# Altium footprint library 3.10-变压器.PcbLib: 33 footprints (part 1 of 3)
Each footprint in its own frame and in the unit in brackets; x right, y up, seen from the top. Pads: shape width x height; smd on the part's side, far side on the other; paste and mask are expansions set on the pad; w line width, h text height; cw(c..) or ccw(c..) is an arc to the next point about the centre after c.
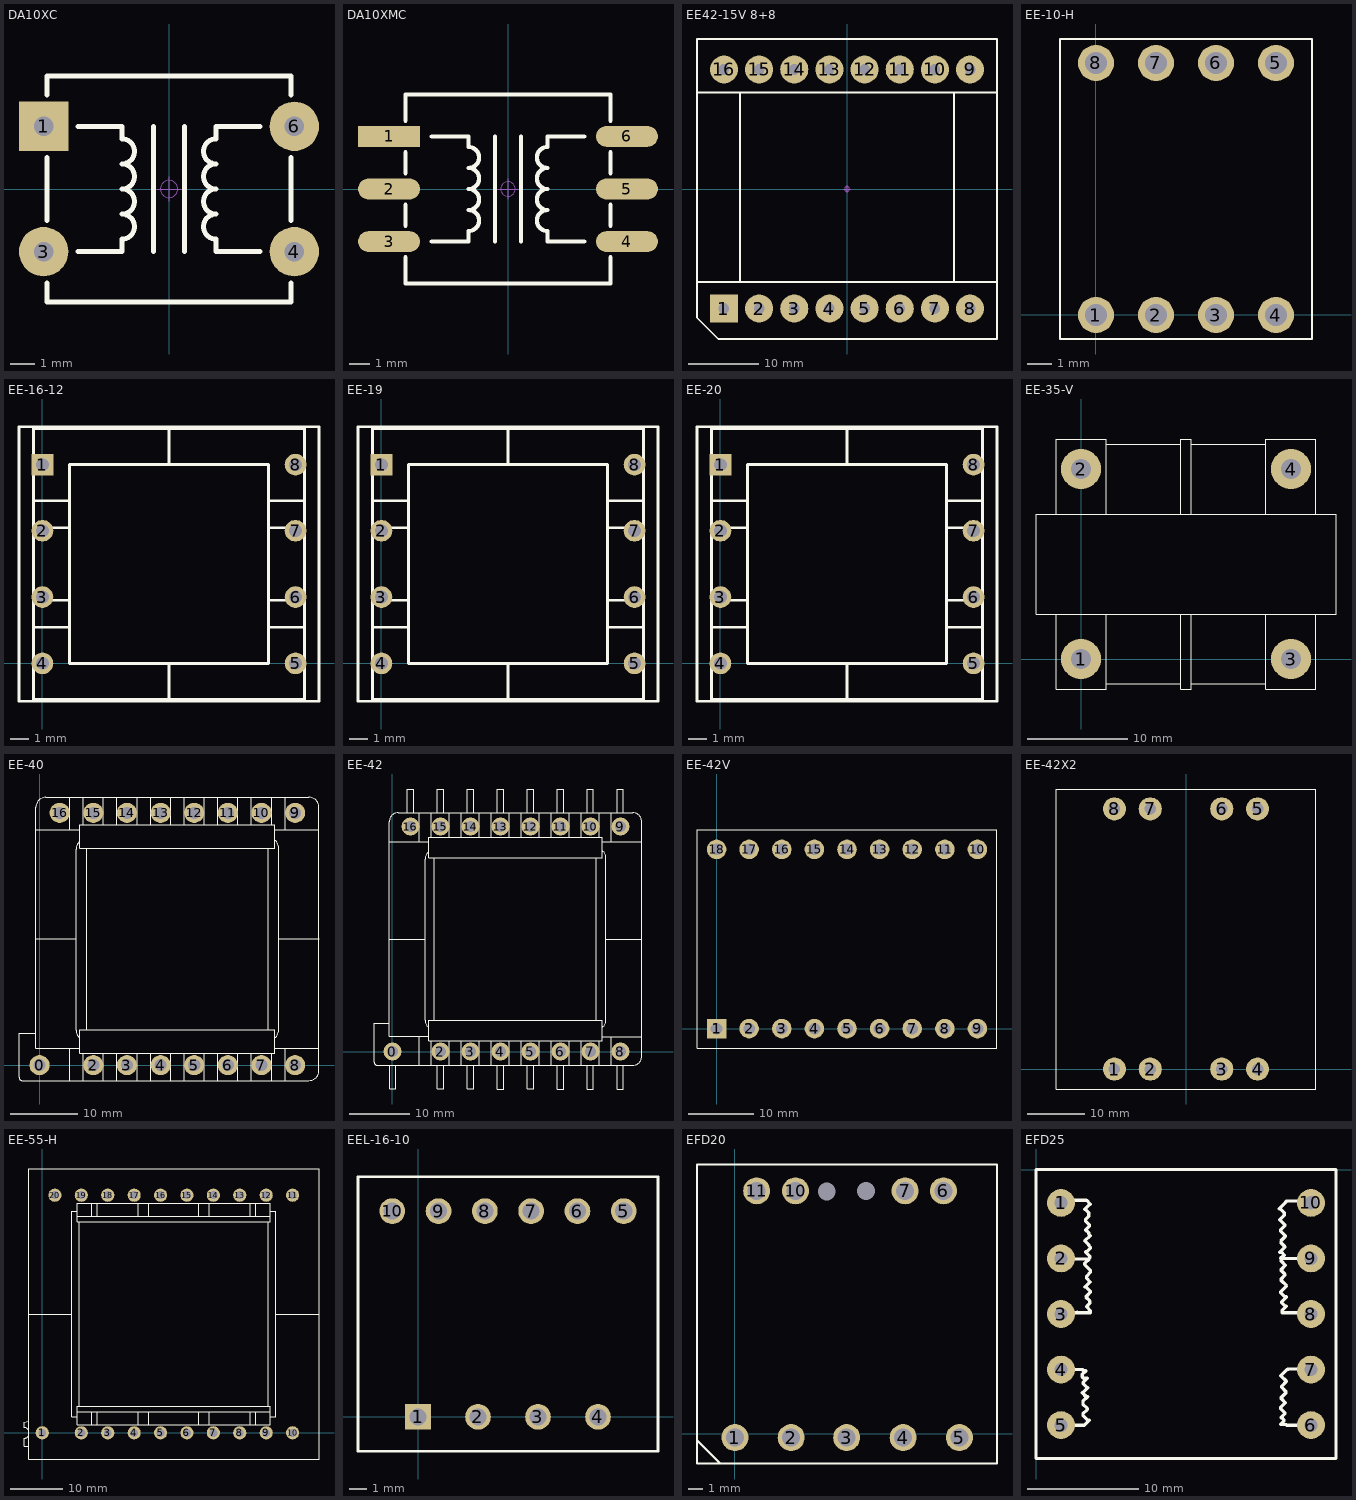
[diagram p0: the footprints below, top view; thin cyan lines are the x and y axes]

## DA10XC [mm] "9mm*9.52mm*6.35mm(长*宽*高)  淘宝ID:黄晶宝石"
pads (4):
  rect 2x2 hole 0.8 unplated: 1(-5.08,2.54)
  round 2 hole 0.8 unplated: 3(-5.08,-2.54) 4(5.08,-2.54) 6(5.08,2.54)
Top Overlay:
  lines w0.203: -4.953,-3.81 -4.953,-4.572 4.953,-4.572 4.953,-3.81 ; -4.953,-1.27 -4.953,1.27 ; -4.953,3.81 -4.953,4.572 4.953,4.572 4.953,3.81 ; -3.683,-2.54 -1.905,-2.54 -1.905,-2.032 ccw(c-1.905,-1.524) -1.905,-1.016 ccw(c-1.905,-0.508) -1.905,0 ccw(c-1.905,0.508) -1.905,1.016 ccw(c-1.905,1.524) -1.905,2.032 -1.905,2.54 -3.683,2.54 ; -0.635,-2.54 -0.635,2.54 ; 0.635,-2.54 0.635,2.54 ; 3.683,-2.54 1.905,-2.54 1.905,-2.032 cw(c1.905,-1.524) 1.905,-1.016 cw(c1.905,-0.508) 1.905,0 cw(c1.905,0.508) 1.905,1.016 cw(c1.905,1.524) 1.905,2.032 1.905,2.54 3.683,2.54 ; 4.953,-1.27 4.953,1.27
Mechanical 15:
  circle w0.05: c0,0 r0.35
  lines w0.05: -0.5,0 0.5,0 ; 0,-0.5 0,0.5
3D body: height 2.95, standoff -6.9, extent -5.205,-4.5 5.205,4.5

## DA10XMC [mm] "9mm*9.52mm*6.35mm(长*宽*高)  淘宝ID:黄晶宝石"
pads (6):
  rect 3x1 smd: 1(-5.75,2.54)
  oval 3x1 smd: 2(-5.75,0) 3(-5.75,-2.54) 4(5.75,-2.54) 5(5.75,0) 6(5.75,2.54)
Top Overlay:
  lines w0.203: -4.953,-3.302 -4.953,-4.572 4.953,-4.572 4.953,-3.302 ; -4.953,-1.778 -4.953,-0.762 ; -4.953,0.762 -4.953,1.778 ; -4.953,3.302 -4.953,4.572 4.953,4.572 4.953,3.302 ; -3.683,-2.54 -1.905,-2.54 -1.905,-2.032 ccw(c-1.905,-1.524) -1.905,-1.016 ccw(c-1.905,-0.508) -1.905,0 ccw(c-1.905,0.508) -1.905,1.016 ccw(c-1.905,1.524) -1.905,2.032 -1.905,2.54 -3.683,2.54 ; -0.635,-2.54 -0.635,2.54 ; 0.635,-2.54 0.635,2.54 ; 3.683,-2.54 1.905,-2.54 1.905,-2.032 cw(c1.905,-1.524) 1.905,-1.016 cw(c1.905,-0.508) 1.905,0 cw(c1.905,0.508) 1.905,1.016 cw(c1.905,1.524) 1.905,2.032 1.905,2.54 3.683,2.54 ; 4.953,-1.778 4.953,-0.762 ; 4.953,0.762 4.953,1.778
Mechanical 15:
  circle w0.05: c0,0 r0.35
  lines w0.05: -0.5,0 0.5,0 ; 0,-0.5 0,0.5
3D body: height 6.4, standoff -0.08, extent -6.35,-4.5 6.35,4.5

## EE42-15V 8+8 [mm] "磁芯 42mm  宽42mm  高32mm"
pads (16):
  rect 4x4 hole 1.5: 1(-17.5,-17)
  round 4 hole 1.5: 2(-12.5,-17) 3(-7.5,-17) 4(-2.5,-17) 5(2.5,-17) 6(7.5,-17) 7(12.5,-17) 8(17.5,-17) 9(17.5,17) 10(12.5,17) 11(7.5,17) 12(2.5,17) 13(-2.5,17) 14(-7.5,17) 15(-12.5,17) 16(-17.5,17)
Top Overlay:
  lines w0.254: -21.336,-13.208 21.336,-13.208 ; -21.336,13.716 21.336,13.716 ; -15.24,-13.208 -15.24,13.716 ; 15.24,-13.208 15.24,13.716 ; -21.336,-18.288 -21.336,21.336 21.336,21.336 21.336,-21.336 -18.288,-21.336 -21.336,-18.288
Mechanical 15:
  circle w0.05: c0,0 r0.35
  lines w0.05: -0.5,0 0.5,0 ; 0,-0.5 0,0.5
3D body: height 31.55, standoff -3.15, extent -21.1,-21.1 21.1,21.1

## EE-10-H [mm] "联系卖家 免费查找封装"
pads (8):
  round 1.5 hole 0.9: 1(0,0) 2(2.5,0) 3(5,0) 4(7.5,0) 5(7.5,10.5) 6(5,10.5) 7(2.5,10.5) 8(0,10.5)
Top Overlay:
  lines w0.1: -1.5,-1 -1.5,11.5 9,11.5 9,-1 -1.5,-1
3D body: height 10.7, standoff -3.8, extent -1.66,-1 9.16,11.5

## EE-16-12 [mm] "联系卖家 免费查找封装"
pads (8):
  rect 1.2x1.2 hole 0.7: 1(0,11)
  round 1.2 hole 0.7: 2(0,7.34) 3(0,3.67) 4(0,0) 5(14,0) 6(14,3.67) 7(14,7.34) 8(14,11)
Top Overlay:
  lines w0.15: -0.5,2 1.5,2 ; -0.5,3.5 1.5,3.5 ; -0.5,7.5 1.5,7.5 ; -0.5,9 1.5,9 ; 7,-2 7,0 ; 7,11 7,13 ; 12.5,2 14.5,2 ; 12.5,3.5 14.5,3.5 ; 12.5,7.5 14.5,7.5 ; 12.5,9 14.5,9 ; -1.3,-2.1 -1.3,13.1 15.3,13.1 15.3,-2.1 -1.3,-2.1 ; -0.5,-2 -0.5,13 14.5,13 14.5,-2 -0.5,-2 ; 1.5,0 12.5,0 12.5,11 1.5,11 1.5,0
3D body: height 17.95, standoff -3.1, extent -0.965,-3.175 14.935,14.525

## EE-19 [mm] "联系卖家 免费查找封装"
pads (8):
  rect 1.2x1.2 hole 0.7: 1(0,11)
  round 1.2 hole 0.7: 2(0,7.34) 3(0,3.67) 4(0,0) 5(14,0) 6(14,3.67) 7(14,7.34) 8(14,11)
Top Overlay:
  lines w0.15: -0.5,2 1.5,2 ; -0.5,3.5 1.5,3.5 ; -0.5,7.5 1.5,7.5 ; -0.5,9 1.5,9 ; 7,-2 7,0 ; 7,11 7,13 ; 12.5,2 14.5,2 ; 12.5,3.5 14.5,3.5 ; 12.5,7.5 14.5,7.5 ; 12.5,9 14.5,9 ; -1.3,-2.1 15.3,-2.1 15.3,13.1 -1.3,13.1 -1.3,-2.1 ; -0.5,-2 14.5,-2 14.5,13 -0.5,13 -0.5,-2 ; 1.5,0 1.5,11 12.5,11 12.5,0 1.5,0
3D body: height 19.2, standoff -4.65, extent -1.24,-3.946 14.5,15.654

## EE-20 [mm] "联系卖家 免费查找封装"
pads (8):
  rect 1.2x1.2 hole 0.7: 1(0,11)
  round 1.2 hole 0.7: 2(0,7.34) 3(0,3.67) 4(0,0) 5(14,0) 6(14,3.67) 7(14,7.34) 8(14,11)
Top Overlay:
  lines w0.15: -0.5,2 1.5,2 ; -0.5,3.5 1.5,3.5 ; -0.5,7.5 1.5,7.5 ; -0.5,9 1.5,9 ; 7,-2 7,0 ; 7,11 7,13 ; 12.5,2 14.5,2 ; 12.5,3.5 14.5,3.5 ; 12.5,7.5 14.5,7.5 ; 12.5,9 14.5,9 ; -1.3,-2.1 -1.3,13.1 15.3,13.1 15.3,-2.1 -1.3,-2.1 ; -0.5,-2 -0.5,13 14.5,13 14.5,-2 -0.5,-2 ; 1.5,0 12.5,0 12.5,11 1.5,11 1.5,0
3D body: height 17, standoff -2, extent -1.732,-4.471 15.768,15.529

## EE-35-V [mm] "淘宝ID:黄晶宝石   店铺网址:https://shop463601444.taobao.com"
pads (4):
  round 4 hole 2: 1(0,0) 2(0,19) 3(21,0) 4(21,19)
Top Overlay:
  lines w0.1: 2.5,-2.453 10,-2.453 ; 2.5,4.5 2.5,-3 -2.5,-3 -2.5,4.5 ; 2.5,14.5 2.5,22 -2.5,22 ; 2.5,21.453 10,21.453 ; 10,4.5 10,-3 11,-3 11,4.5 ; 10,14.5 10,22 11,22 11,14.5 ; 11,-2.453 18.5,-2.453 ; 11,21.453 18.5,21.453 ; 18.5,4.5 18.5,-3 23.5,-3 23.5,4.5 ; 18.5,14.5 18.5,22 23.5,22 23.5,14.5 ; -2.5,4.5 23.5,4.5 ; -2.5,4.5 -4.5,4.5 -4.5,14.5 25.5,14.5 25.5,4.5 23.5,4.5 ; -2.5,22 -2.5,14.5 -2.5,22 ; 0,19.25 0,19.25
3D body: height 35.61, standoff -5.5, extent -4.57,-2.921 24.89,21.579

## EE-40 [mm] "淘宝ID:黄晶宝石   店铺网址:https://shop463601444.taobao.com"
pads (16):
  round 3 hole 1.8: 0(0,0) 2(8,0) 3(13,0) 4(18,0) 5(23,0) 6(28,0) 7(33,0) 8(38,0) 9(38,37.5) 10(33,37.5) 11(28,37.5) 12(23,37.5) 13(18,37.5) 14(13,37.5) 15(8,37.5) 16(3,37.5)
Top Overlay:
  lines w0.1: -2.55,-2.303 40.05,-2.303 ; -2.55,-2.3 cw(c-2.55,-1.8) -3.05,-1.8 -3.05,4.7 -0.556,4.7 ; -0.55,2.509 -0.55,38.3 cw(c0.95,38.3) 0.95,39.8 40.05,39.8 cw(c40.05,38.3) 41.55,38.3 41.55,-0.8 cw(c40.05,-0.8) 40.05,-2.3 ; -0.55,18.75 5.449,18.75 ; -0.544,2.509 6,2.509 ; -0.544,34.991 6,34.991 ; 4.5,-2.303 4.5,2.509 ; 4.5,34.991 4.5,39.8 ; 5.995,4.043 cw(c6.949,5.2) 5.449,5.2 5.449,32.079 cw(c6.949,32.079) 5.995,33.236 ; 6.5,-2.303 6.5,1.75 ; 6.5,35.75 6.5,39.8 ; 7,5.25 7,32.25 ; 9.5,-2.303 9.5,1.75 ; 9.5,35.75 9.5,39.8 ; 11.5,-2.303 11.5,1.75 ; 11.5,35.75 11.5,39.8 ; 14.5,-2.303 14.5,1.75 ; 14.5,35.75 14.5,39.8 ; 16.5,-2.303 16.5,1.75 ; 16.5,35.75 16.5,39.8 ; 19.5,-2.303 19.5,1.75 ; 19.5,35.75 19.5,39.8 ; 21.5,-2.303 21.5,1.75 ; 21.5,35.75 21.5,39.8 ; 24.5,-2.303 24.5,1.75 ; 24.5,35.75 24.5,39.8 ; 26.5,-2.303 26.5,1.75 ; 26.5,35.75 26.5,39.8 ; 29.5,-2.303 29.5,1.75 ; 29.5,35.75 29.5,39.8 ; 31.5,-2.303 31.5,1.75 ; 31.5,35.75 31.5,39.8 ; 34,5.25 34,32.25 ; 34.5,-2.303 34.5,1.75 ; 34.5,35.75 34.5,39.8 ; 35,2.5 41.55,2.5 ; 35,35 41.55,35 ; 35.005,4.042 ccw(c34.051,5.199) 35.551,5.199 35.551,32.3 ccw(c34.051,32.3) 35.005,33.457 ; 35.551,18.75 41.55,18.75 ; 36.5,-2.303 36.5,2.5 ; 36.5,35 36.5,39.8 ; 6,1.75 6,5.25 35,5.25 35,1.75 ; 6,1.75 35,1.75 ; 6,1.75 35,1.75 ; 6,32.25 6,35.75 35,35.75 35,32.25 6,32.25
3D body: height 32.94, standoff -3.5, extent 0.254,-3.478 40.259,40.562

## EE-42 [mm] "淘宝ID:黄晶宝石   店铺网址:https://shop463601444.taobao.com"
pads (16):
  round 3 hole 1.8: 0(0,0) 2(8,0) 3(13,0) 4(18,0) 5(23,0) 6(28,0) 7(33,0) 8(38,0) 9(38,37.5) 10(33,37.5) 11(28,37.5) 12(23,37.5) 13(18,37.5) 14(13,37.5) 15(8,37.5) 16(3,37.5)
Top Overlay:
  lines w0.1: -2.55,-2.303 40.05,-2.303 ; -2.55,-2.3 cw(c-2.55,-1.8) -3.05,-1.8 -3.05,4.7 -0.556,4.7 ; -0.55,2.509 -0.55,38.3 cw(c0.95,38.3) 0.95,39.8 40.05,39.8 cw(c40.05,38.3) 41.55,38.3 41.55,-0.8 cw(c40.05,-0.8) 40.05,-2.3 ; -0.55,18.75 5.449,18.75 ; -0.544,2.509 6,2.509 ; -0.544,34.991 6,34.991 ; -0.5,-2.303 -0.5,-6.248 0.5,-6.248 0.5,-2.303 ; 2.5,39.809 2.5,43.75 3.5,43.75 3.5,39.814 ; 4.5,-2.303 4.5,2.509 ; 4.5,34.991 4.5,39.8 ; 5.995,4.043 cw(c6.949,5.2) 5.449,5.2 5.449,32.079 cw(c6.949,32.079) 5.995,33.236 ; 6.5,-2.303 6.5,1.75 ; 6.5,35.75 6.5,39.8 ; 7,5.25 7,32.25 ; 7.5,-2.3 7.5,-6.248 8.493,-6.248 8.5,-6.241 8.5,-2.3 ; 7.5,39.8 7.5,43.748 8.493,43.748 8.5,43.741 8.5,39.8 ; 9.5,-2.303 9.5,1.75 ; 9.5,35.75 9.5,39.8 ; 11.5,-2.303 11.5,1.75 ; 11.5,35.75 11.5,39.8 ; 12.5,-2.3 12.5,-6.247 13.5,-6.247 13.5,-2.3 ; 12.5,39.8 12.5,43.747 13.5,43.747 13.5,39.8 ; 14.5,-2.303 14.5,1.75 ; 14.5,35.75 14.5,39.8 ; 16.5,-2.303 16.5,1.75 ; 16.5,35.75 16.5,39.8 ; 17.5,-2.3 17.5,-6.25 18.5,-6.25 18.5,-2.311 ; 17.5,39.8 17.5,43.75 18.5,43.75 18.5,39.811 ; 19.5,-2.303 19.5,1.75 ; 19.5,35.75 19.5,39.8 ; 21.5,-2.303 21.5,1.75 ; 21.5,35.75 21.5,39.8 ; 22.5,-2.3 22.5,-6.238 23.495,-6.238 23.5,-6.233 23.5,-2.3 ; 22.5,39.8 22.5,43.738 23.495,43.738 23.5,43.733 23.5,39.8 ; 24.5,-2.303 24.5,1.75 ; 24.5,35.75 24.5,39.8 ; 26.5,-2.303 26.5,1.75 ; 26.5,35.75 26.5,39.8 ; 27.5,-2.311 27.5,-6.25 28.5,-6.25 28.5,-2.313 ; 27.5,39.811 27.5,43.75 28.5,43.75 28.5,39.813 ; 29.5,-2.303 29.5,1.75 ; 29.5,35.75 29.5,39.8 ; 31.5,-2.303 31.5,1.75 ; 31.5,35.75 31.5,39.8 ; 32.5,-2.309 32.5,-6.25 33.488,-6.25 33.488,-2.313 ; 32.5,39.809 32.5,43.75 33.488,43.75 33.488,39.813 ; 34,5.25 34,32.25 ; 34.5,-2.303 34.5,1.75 ; 34.5,35.75 34.5,39.8 ; 35,2.5 41.55,2.5 ; 35,35 41.55,35 ; 35.005,4.042 ccw(c34.051,5.199) 35.551,5.199 35.551,32.3 ccw(c34.051,32.3) 35.005,33.457 ; 35.551,18.75 41.55,18.75 ; 36.5,-2.303 36.5,2.5 ; 36.5,35 36.5,39.8 ; 37.5,-2.324 37.5,-6.25 38.5,-6.25 38.5,-2.317 ; 37.5,39.824 37.5,43.75 38.5,43.75 38.5,39.817 ; 6,1.75 6,5.25 35,5.25 35,1.75 ; 6,1.75 35,1.75 ; 6,1.75 35,1.75 ; 6,32.25 6,35.75 35,35.75 35,32.25 6,32.25
3D body: height 29.2, standoff -5, extent -0.229,-3 40.271,40.5

## EE-42V [mm] "淘宝ID:黄晶宝石   店铺网址:https://shop463601444.taobao.com"
pads (18):
  rect 3x3 hole 1.8: 1(0,0)
  round 3 hole 1.8: 2(5,0) 3(10,0) 4(15,0) 5(20,0) 6(25,0) 7(30,0) 8(35,0) 9(40,0) 10(40,27.5) 11(35,27.5) 12(30,27.5) 13(25,27.5) 14(20,27.5) 15(15,27.5) 16(10,27.5) 17(5,27.5) 18(0,27.5)
Top Overlay:
  lines w0.1: -3,-3 -3,30.5 43,30.5 43,-3 -3,-3
3D body: height 48.8, standoff -4.15, extent -2.667,-2.855 42.833,29.845

## EE-42X2 [mm] "淘宝ID:黄晶宝石   店铺网址:https://shop463601444.taobao.com"
pads (8):
  round 4 hole 2: 1(-12.4,0) 2(-6.2,0) 3(6.2,0) 4(12.4,0) 5(12.4,45.1) 6(6.2,45.1) 7(-6.2,45.1) 8(-12.4,45.1)
Top Overlay:
  lines w0.1: -22.5,-3.45 -22.5,48.55 22.5,48.55 22.5,-3.45 -22.5,-3.45
3D body: height 44.16, standoff -3.2, extent -21.227,-1.905 20.973,47.095

## EE-55-H [mm]
pads (20):
  round 2.5 hole 1.5: 1(0,0) 2(7.4,0) 3(12.4,0) 4(17.4,0) 5(22.4,0) 6(27.4,0) 7(32.4,0) 8(37.4,0) 9(42.4,0) 10(47.4,0) 11(47.4,45) 12(42.4,45) 13(37.4,45) 14(32.4,45) 15(27.4,45) 16(22.4,45) 17(17.4,45) 18(12.4,45) 19(7.4,45) 20(2.4,45)
Top Overlay:
  lines w0.1: -3.4,-1 ccw(c-3.4,0) -2.605,-0.607 ; -3.4,1 cw(c-3.4,0) -2.605,0.607
  lines w0.2: -3.4,-1 -3.4,-2.5 -2.613,-2.5 ; -3.4,1 -3.4,2 -2.603,2.214 ; -2.566,22.5 5.585,22.5 ; 6.589,3 5.6,3 5.6,42 6.589,42 ; 6.6,1.5 43.2,1.5 ; 6.6,40.002 6.6,43.5 43.2,43.5 ; 6.602,1.502 6.602,5 43.198,5 43.198,1.502 ; 6.602,4 43.198,4 ; 6.602,40 43.198,40 43.198,43.498 ; 6.602,41 43.198,41 ; 7,5 7,40 ; 9.4,1.507 9.4,4.002 ; 9.4,40.998 9.4,43.493 ; 10.4,1.507 10.4,4.002 ; 10.4,40.998 10.4,43.493 ; 18.15,1.514 18.15,3.993 ; 18.15,41.007 18.15,43.486 ; 20.15,1.514 20.15,3.993 ; 20.15,41.007 20.15,43.486 ; 29.65,1.514 29.65,3.993 ; 29.65,41.007 29.65,43.486 ; 31.65,1.514 31.65,3.993 ; 31.65,41.007 31.65,43.486 ; 39.4,1.507 39.4,3.993 ; 39.4,41.007 39.4,43.493 ; 40.4,1.507 40.4,3.993 ; 40.4,41.007 40.4,43.493 ; 42.8,4.992 42.8,39.992 ; 43.211,3 44.2,3 44.2,42 43.211,42 ; 44.215,22.5 52.366,22.5 ; -2.6,-5 52.4,-5 52.4,50 -2.6,50 -2.6,-5
3D body: height 50.03, standoff -4.2, extent -3.302,-5.086 52.528,50.044

## EEL-16-10 [mm] "联系卖家 免费查找封装"
pads (10):
  rect 1.5x1.5 hole 1: 1(0,0)
  round 1.5 hole 1: 2(3.5,0) 3(7,0) 4(10.5,0) 5(12,12) 6(9.3,12) 7(6.6,12) 8(3.9,12) 9(1.2,12) 10(-1.5,12)
Top Overlay:
  lines w0.15: -3.5,-2 14,-2 14,14 -3.5,14 -3.5,-2
3D body: height 17.95, standoff -3.1, extent -3.6,-1.95 14.1,13.95

## EFD20 [mil]
pads (11):
  round 71 hole 47.24: 1(0,-9.84) 2(148,-9.84) 3(294,-9.84) 4(443,-9.84) 5(591,-9.84) 6(549,639.76) 7(448,639.76) 10(159.46,639.76)
  round 0 hole 47.24: 8(345,639.76) 9(241.61,638.58)
  round 70.98 hole 47.24: 11(57.13,639.76)
Top Overlay:
  lines w6: -100,-17 -39,-78 ; 289,-78 690,-78 690,709 -100,709 -100,-78 294,-78
3D body: height 620.08, standoff -137.8, extent -98.7,-168.75 688.7,799.75

## EFD25 [mm] "联系卖家 免费查找封装"
pads (10):
  round 2.5 hole 1.2: 1(2.25,-3) 2(2.25,-8) 3(2.25,-13) 4(2.25,-18) 5(2.25,-23) 6(24.75,-23) 7(24.75,-18) 8(24.75,-13) 9(24.75,-8) 10(24.75,-3)
Top Overlay:
  drawing of 158 lines, arcs and shapes, not listed
3D body: height 12.9, standoff -3.5, extent 0.066,-26.59 26.934,0.59